# Altium footprint library HDR2.54.PcbLib: 242 footprints (part 11 of 16)
Each footprint in its own frame and in the unit in brackets; x right, y up, seen from the top. Pads: shape width x height; smd on the part's side, far side on the other; paste and mask are expansions set on the pad; w line width, h text height; cw(c..) or ccw(c..) is an arc to the next point about the centre after c.
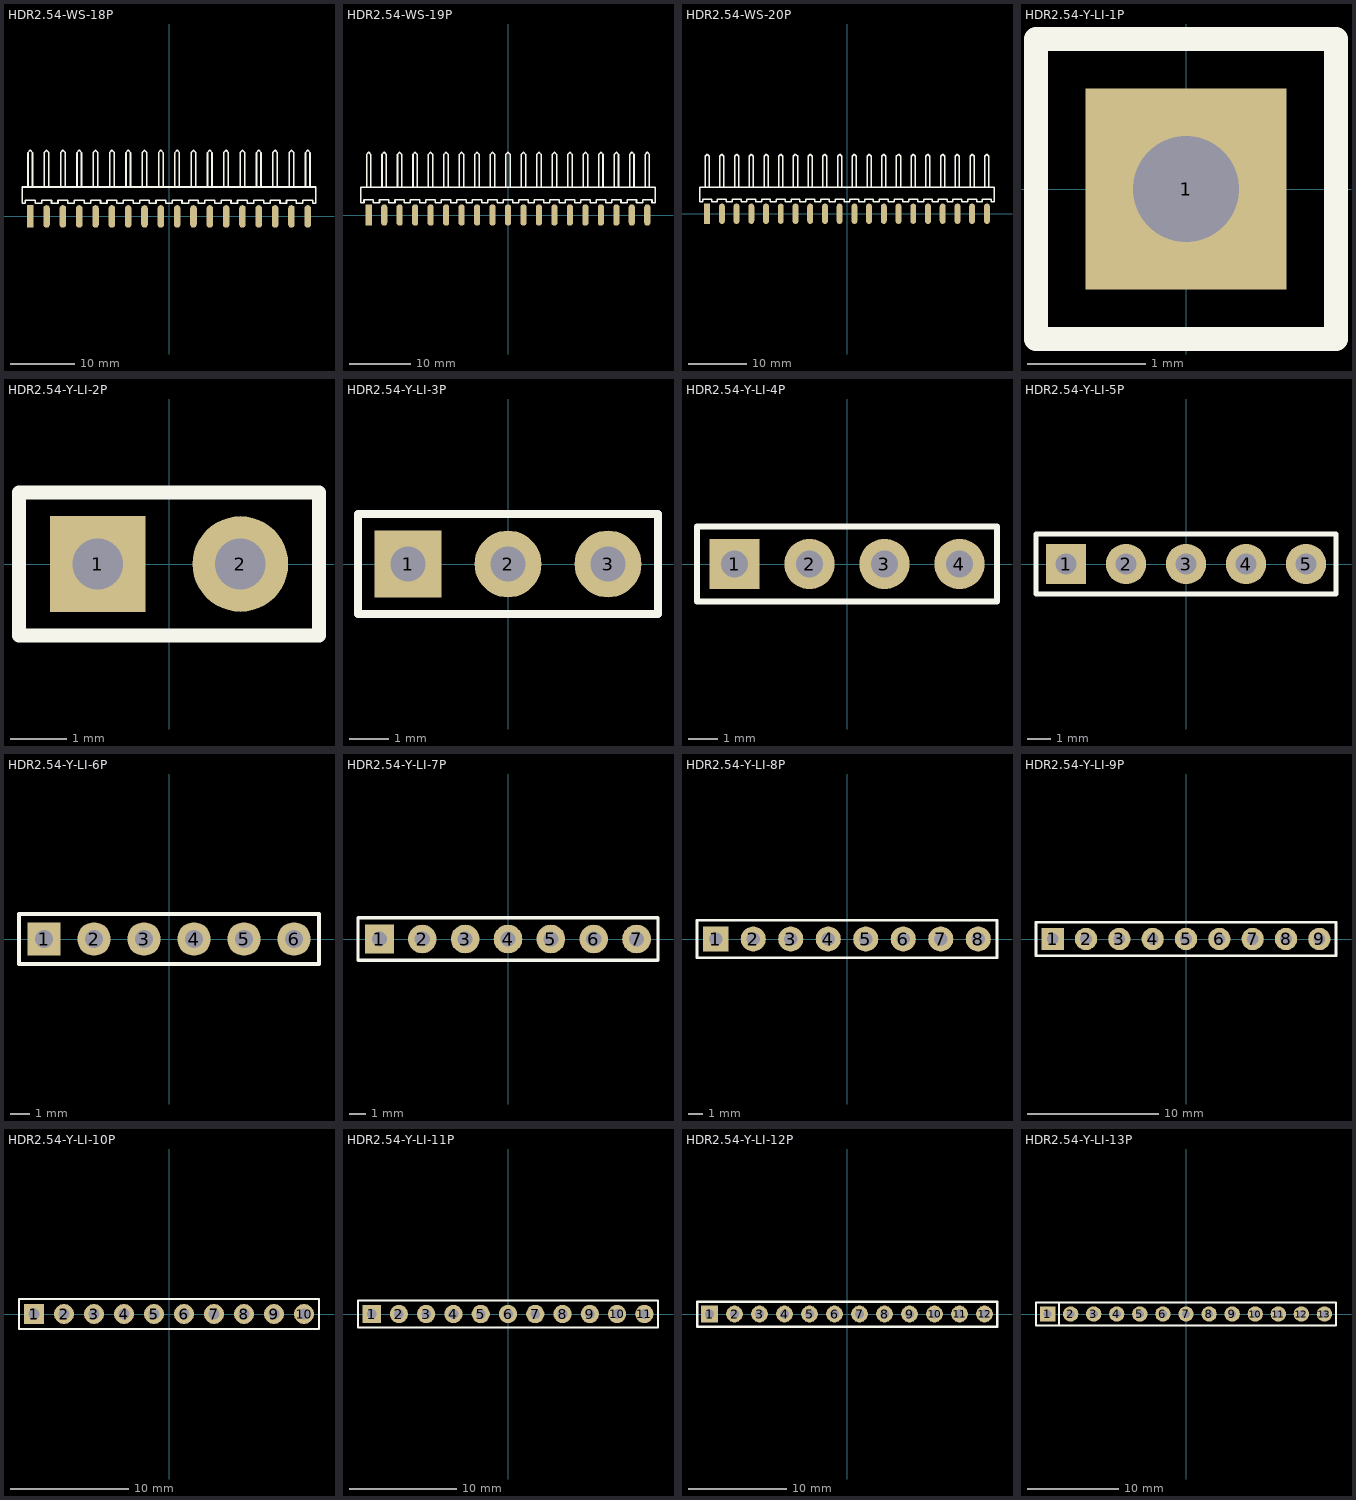
[diagram p10: the footprints below, top view; thin cyan lines are the x and y axes]

## HDR2.54-WS-18P [mm] "18P��ʽ��Ƭ����2.54"
pads (18):
  rect 1.02x3.5 smd: 1(-21.59,0)
  oval 1.02x3.5 smd: 2(-19.05,0) 3(-16.51,0) 4(-13.97,0) 5(-11.43,0) 6(-8.89,0) 7(-6.35,0) 8(-3.81,0) 9(-1.27,0) 10(1.27,0) 11(3.81,0) 12(6.35,0) 13(8.89,0) 14(11.43,0) 15(13.97,0) 16(16.51,0) 17(19.05,0) 18(21.59,0)
Top Overlay:
  drawing of 236 lines, arcs and shapes, not listed
3D body "HDR2.54 S-W-1P.STEP": height 2.54, standoff -0.01, extent 20.32,-0.76 22.86,10.34
3D body "HDR2.54 S-W-1P.STEP": height 2.54, standoff -0.01, extent 17.78,-0.76 20.32,10.34
3D body "HDR2.54 S-W-1P.STEP": height 2.54, standoff -0.01, extent 15.24,-0.76 17.78,10.34
3D body "HDR2.54 S-W-1P.STEP": height 2.54, standoff -0.01, extent 12.7,-0.76 15.24,10.34
3D body "HDR2.54 S-W-1P.STEP": height 2.54, standoff -0.01, extent 7.62,-0.76 10.16,10.34
3D body "HDR2.54 S-W-1P.STEP": height 2.54, standoff -0.01, extent 5.08,-0.76 7.62,10.34
3D body "HDR2.54 S-W-1P.STEP": height 2.54, standoff -0.01, extent 2.54,-0.76 5.08,10.34
3D body "HDR2.54 S-W-1P.STEP": height 2.54, standoff -0.01, extent 0,-0.76 2.54,10.34
3D body "HDR2.54 S-W-1P.STEP": height 2.54, standoff -0.01, extent -2.54,-0.76 0,10.34
3D body "HDR2.54 S-W-1P.STEP": height 2.54, standoff -0.01, extent -5.08,-0.76 -2.54,10.34
3D body "HDR2.54 S-W-1P.STEP": height 2.54, standoff -0.01, extent -7.62,-0.76 -5.08,10.34
3D body "HDR2.54 S-W-1P.STEP": height 2.54, standoff -0.01, extent -10.16,-0.76 -7.62,10.34
3D body "HDR2.54 S-W-1P.STEP": height 2.54, standoff -0.01, extent -22.86,-0.76 -20.32,10.34
3D body "HDR2.54 S-W-1P.STEP": height 2.54, standoff -0.01, extent -20.32,-0.76 -17.78,10.34
3D body "HDR2.54 S-W-1P.STEP": height 2.54, standoff -0.01, extent -17.78,-0.76 -15.24,10.34
3D body "HDR2.54 S-W-1P.STEP": height 2.54, standoff -0.01, extent -15.24,-0.76 -12.7,10.34
3D body "HDR2.54 S-W-1P.STEP": height 2.54, standoff -0.01, extent -12.7,-0.76 -10.16,10.34
3D body "HDR2.54 S-W-1P.STEP": height 2.54, standoff -0.01, extent 10.16,-0.76 12.7,10.34

## HDR2.54-WS-19P [mm] "19P��ʽ��Ƭ����2.54  �Ա�ID:�ƾ���ʯ   ������ַ:https://shop463601444.taobao.com"
pads (19):
  rect 1.02x3.5 smd: 1(-22.86,0)
  oval 1.02x3.5 smd: 2(-20.32,0) 3(-17.78,0) 4(-15.24,0) 5(-12.7,0) 6(-10.16,0) 7(-7.62,0) 8(-5.08,0) 9(-2.54,0) 10(0,0) 11(2.54,0) 12(5.08,0) 13(7.62,0) 14(10.16,0) 15(12.7,0) 16(15.24,0) 17(17.78,0) 18(20.32,0) 19(22.86,0)
Top Overlay:
  drawing of 249 lines, arcs and shapes, not listed
3D body "HDR2.54 S-W-1P.STEP": height 2.54, standoff -0.01, extent 21.59,-0.76 24.13,10.34
3D body "HDR2.54 S-W-1P.STEP": height 2.54, standoff -0.01, extent 19.05,-0.76 21.59,10.34
3D body "HDR2.54 S-W-1P.STEP": height 2.54, standoff -0.01, extent 16.51,-0.76 19.05,10.34
3D body "HDR2.54 S-W-1P.STEP": height 2.54, standoff -0.01, extent 13.97,-0.76 16.51,10.34
3D body "HDR2.54 S-W-1P.STEP": height 2.54, standoff -0.01, extent 11.43,-0.76 13.97,10.34
3D body "HDR2.54 S-W-1P.STEP": height 2.54, standoff -0.01, extent 6.35,-0.76 8.89,10.34
3D body "HDR2.54 S-W-1P.STEP": height 2.54, standoff -0.01, extent 3.81,-0.76 6.35,10.34
3D body "HDR2.54 S-W-1P.STEP": height 2.54, standoff -0.01, extent 1.27,-0.76 3.81,10.34
3D body "HDR2.54 S-W-1P.STEP": height 2.54, standoff -0.01, extent -1.27,-0.76 1.27,10.34
3D body "HDR2.54 S-W-1P.STEP": height 2.54, standoff -0.01, extent -3.81,-0.76 -1.27,10.34
3D body "HDR2.54 S-W-1P.STEP": height 2.54, standoff -0.01, extent -6.35,-0.76 -3.81,10.34
3D body "HDR2.54 S-W-1P.STEP": height 2.54, standoff -0.01, extent -8.89,-0.76 -6.35,10.34
3D body "HDR2.54 S-W-1P.STEP": height 2.54, standoff -0.01, extent -11.43,-0.76 -8.89,10.34
3D body "HDR2.54 S-W-1P.STEP": height 2.54, standoff -0.01, extent -24.13,-0.76 -21.59,10.34
3D body "HDR2.54 S-W-1P.STEP": height 2.54, standoff -0.01, extent -21.59,-0.76 -19.05,10.34
3D body "HDR2.54 S-W-1P.STEP": height 2.54, standoff -0.01, extent -19.05,-0.76 -16.51,10.34
3D body "HDR2.54 S-W-1P.STEP": height 2.54, standoff -0.01, extent -16.51,-0.76 -13.97,10.34
3D body "HDR2.54 S-W-1P.STEP": height 2.54, standoff -0.01, extent -13.97,-0.76 -11.43,10.34
3D body "HDR2.54 S-W-1P.STEP": height 2.54, standoff -0.01, extent 8.89,-0.76 11.43,10.34

## HDR2.54-WS-20P [mm] "20P��ʽ��Ƭ����2.54"
pads (20):
  rect 1.02x3.5 smd: 1(-24.13,0)
  oval 1.02x3.5 smd: 2(-21.59,0) 3(-19.05,0) 4(-16.51,0) 5(-13.97,0) 6(-11.43,0) 7(-8.89,0) 8(-6.35,0) 9(-3.81,0) 10(-1.27,0) 11(1.27,0) 12(3.81,0) 13(6.35,0) 14(8.89,0) 15(11.43,0) 16(13.97,0) 17(16.51,0) 18(19.05,0) 19(21.59,0) 20(24.13,0)
Top Overlay:
  drawing of 262 lines, arcs and shapes, not listed
3D body "HDR2.54 S-W-1P.STEP": height 2.54, standoff -0.01, extent 22.86,-0.76 25.4,10.34
3D body "HDR2.54 S-W-1P.STEP": height 2.54, standoff -0.01, extent 7.62,-0.76 10.16,10.34
3D body "HDR2.54 S-W-1P.STEP": height 2.54, standoff -0.01, extent -15.24,-0.76 -12.7,10.34
3D body "HDR2.54 S-W-1P.STEP": height 2.54, standoff -0.01, extent -17.78,-0.76 -15.24,10.34
3D body "HDR2.54 S-W-1P.STEP": height 2.54, standoff -0.01, extent -20.32,-0.76 -17.78,10.34
3D body "HDR2.54 S-W-1P.STEP": height 2.54, standoff -0.01, extent -22.86,-0.76 -20.32,10.34
3D body "HDR2.54 S-W-1P.STEP": height 2.54, standoff -0.01, extent -25.4,-0.76 -22.86,10.34
3D body "HDR2.54 S-W-1P.STEP": height 2.54, standoff -0.01, extent -12.7,-0.76 -10.16,10.34
3D body "HDR2.54 S-W-1P.STEP": height 2.54, standoff -0.01, extent -10.16,-0.76 -7.62,10.34
3D body "HDR2.54 S-W-1P.STEP": height 2.54, standoff -0.01, extent -7.62,-0.76 -5.08,10.34
3D body "HDR2.54 S-W-1P.STEP": height 2.54, standoff -0.01, extent -5.08,-0.76 -2.54,10.34
3D body "HDR2.54 S-W-1P.STEP": height 2.54, standoff -0.01, extent -2.54,-0.76 0,10.34
3D body "HDR2.54 S-W-1P.STEP": height 2.54, standoff -0.01, extent 0,-0.76 2.54,10.34
3D body "HDR2.54 S-W-1P.STEP": height 2.54, standoff -0.01, extent 2.54,-0.76 5.08,10.34
3D body "HDR2.54 S-W-1P.STEP": height 2.54, standoff -0.01, extent 5.08,-0.76 7.62,10.34
3D body "HDR2.54 S-W-1P.STEP": height 2.54, standoff -0.01, extent 10.16,-0.76 12.7,10.34
3D body "HDR2.54 S-W-1P.STEP": height 2.54, standoff -0.01, extent 12.7,-0.76 15.24,10.34
3D body "HDR2.54 S-W-1P.STEP": height 2.54, standoff -0.01, extent 15.24,-0.76 17.78,10.34
3D body "HDR2.54 S-W-1P.STEP": height 2.54, standoff -0.01, extent 17.78,-0.76 20.32,10.34
3D body "HDR2.54 S-W-1P.STEP": height 2.54, standoff -0.01, extent 20.32,-0.76 22.86,10.34

## HDR2.54-Y-LI-1P [mm] "Բ����ĸ��1��"
pads (1):
  rect 1.7x1.7 hole 0.9: 1(0,0)
Top Overlay:
  lines w0.2: -1.27,-1.27 1.27,-1.27 1.27,1.27 -1.27,1.27 -1.27,-1.27
3D body "HDR-1P_Y.STEP": height 4.31, standoff -3, extent -1.27,-1.27 1.27,1.27

## HDR2.54-Y-LI-2P [mm] "Բ����ĸ��2��"
pads (2):
  rect 1.7x1.7 hole 0.9: 1(-1.27,0)
  round 1.7 hole 0.9: 2(1.27,0)
Top Overlay:
  lines w0.254: -2.667,-1.27 2.667,-1.27 2.667,1.27 -2.667,1.27 -2.667,-1.27
3D body "HDR-1P_Y.STEP": height 4.31, standoff -3, extent -2.54,-1.27 0,1.27
3D body "HDR-1P_Y.STEP": height 4.31, standoff -3, extent 0,-1.27 2.54,1.27

## HDR2.54-Y-LI-3P [mm] "Բ����ĸ��3��"
pads (3):
  rect 1.7x1.7 hole 0.9: 1(-2.54,0)
  round 1.7 hole 0.9: 2(0,0) 3(2.54,0)
Top Overlay:
  lines w0.2: -3.81,-1.27 3.81,-1.27 3.81,1.27 -3.81,1.27 -3.81,-1.27
3D body "HDR-1P_Y.STEP": height 4.31, standoff -3, extent -3.81,-1.27 -1.27,1.27
3D body "HDR-1P_Y.STEP": height 4.31, standoff -3, extent -1.27,-1.27 1.27,1.27
3D body "HDR-1P_Y.STEP": height 4.31, standoff -3, extent 1.27,-1.27 3.81,1.27

## HDR2.54-Y-LI-4P [mm] "Բ����ĸ��4��"
pads (4):
  rect 1.7x1.7 hole 0.9: 1(-3.81,0)
  round 1.7 hole 0.9: 2(-1.27,0) 3(1.27,0) 4(3.81,0)
Top Overlay:
  lines w0.2: -5.08,-1.27 5.08,-1.27 5.08,1.27 -5.08,1.27 -5.08,-1.27
3D body "HDR-1P_Y.STEP": height 4.31, standoff -3, extent -5.08,-1.27 -2.54,1.27
3D body "HDR-1P_Y.STEP": height 4.31, standoff -3, extent -2.54,-1.27 0,1.27
3D body "HDR-1P_Y.STEP": height 4.31, standoff -3, extent 0,-1.27 2.54,1.27
3D body "HDR-1P_Y.STEP": height 4.31, standoff -3, extent 2.54,-1.27 5.08,1.27

## HDR2.54-Y-LI-5P [mm] "Բ����ĸ��5��"
pads (5):
  rect 1.7x1.7 hole 0.9: 1(-5.08,0)
  round 1.7 hole 0.9: 2(-2.54,0) 3(0,0) 4(2.54,0) 5(5.08,0)
Top Overlay:
  lines w0.2: -6.35,-1.27 6.35,-1.27 6.35,1.27 -6.35,1.27 -6.35,-1.27
3D body "HDR-1P_Y.STEP": height 4.31, standoff -3, extent 3.81,-1.27 6.35,1.27
3D body "HDR-1P_Y.STEP": height 4.31, standoff -3, extent 1.27,-1.27 3.81,1.27
3D body "HDR-1P_Y.STEP": height 4.31, standoff -3, extent -1.27,-1.27 1.27,1.27
3D body "HDR-1P_Y.STEP": height 4.31, standoff -3, extent -3.81,-1.27 -1.27,1.27
3D body "HDR-1P_Y.STEP": height 4.31, standoff -3, extent -6.35,-1.27 -3.81,1.27

## HDR2.54-Y-LI-6P [mm] "Բ����ĸ��6��"
pads (6):
  rect 1.7x1.7 hole 0.9: 1(-6.35,0)
  round 1.7 hole 0.9: 2(-3.81,0) 3(-1.27,0) 4(1.27,0) 5(3.81,0) 6(6.35,0)
Top Overlay:
  lines w0.2: -7.62,-1.27 7.62,-1.27 7.62,1.27 -7.62,1.27 -7.62,-1.27
3D body "HDR-1P_Y.STEP": height 4.31, standoff -3, extent -7.62,-1.27 -5.08,1.27
3D body "HDR-1P_Y.STEP": height 4.31, standoff -3, extent -5.08,-1.27 -2.54,1.27
3D body "HDR-1P_Y.STEP": height 4.31, standoff -3, extent -2.54,-1.27 0,1.27
3D body "HDR-1P_Y.STEP": height 4.31, standoff -3, extent 0,-1.27 2.54,1.27
3D body "HDR-1P_Y.STEP": height 4.31, standoff -3, extent 2.54,-1.27 5.08,1.27
3D body "HDR-1P_Y.STEP": height 4.31, standoff -3, extent 5.08,-1.27 7.62,1.27

## HDR2.54-Y-LI-7P [mm] "Բ����ĸ��7��"
pads (7):
  rect 1.7x1.7 hole 0.9: 1(-7.62,0)
  round 1.7 hole 0.9: 2(-5.08,0) 3(-2.54,0) 4(0,0) 5(2.54,0) 6(5.08,0) 7(7.62,0)
Top Overlay:
  lines w0.2: -8.89,-1.27 8.89,-1.27 8.89,1.27 -8.89,1.27 -8.89,-1.27
3D body "HDR-1P_Y.STEP": height 4.31, standoff -3, extent -8.89,-1.27 -6.35,1.27
3D body "HDR-1P_Y.STEP": height 4.31, standoff -3, extent -6.35,-1.27 -3.81,1.27
3D body "HDR-1P_Y.STEP": height 4.31, standoff -3, extent -3.81,-1.27 -1.27,1.27
3D body "HDR-1P_Y.STEP": height 4.31, standoff -3, extent -1.27,-1.27 1.27,1.27
3D body "HDR-1P_Y.STEP": height 4.31, standoff -3, extent 1.27,-1.27 3.81,1.27
3D body "HDR-1P_Y.STEP": height 4.31, standoff -3, extent 3.81,-1.27 6.35,1.27
3D body "HDR-1P_Y.STEP": height 4.31, standoff -3, extent 6.35,-1.27 8.89,1.27

## HDR2.54-Y-LI-8P [mm] "Բ����ĸ��8��"
pads (8):
  rect 1.7x1.7 hole 0.9: 1(-8.89,0)
  round 1.7 hole 0.9: 2(-6.35,0) 3(-3.81,0) 4(-1.27,0) 5(1.27,0) 6(3.81,0) 7(6.35,0) 8(8.89,0)
Top Overlay:
  lines w0.2: -10.16,-1.27 -10.16,1.27 10.16,1.27 10.16,-1.27 -10.16,-1.27
3D body "HDR-1P_Y.STEP": height 4.31, standoff -3, extent 7.62,-1.27 10.16,1.27
3D body "HDR-1P_Y.STEP": height 4.31, standoff -3, extent 5.08,-1.27 7.62,1.27
3D body "HDR-1P_Y.STEP": height 4.31, standoff -3, extent 2.54,-1.27 5.08,1.27
3D body "HDR-1P_Y.STEP": height 4.31, standoff -3, extent 0,-1.27 2.54,1.27
3D body "HDR-1P_Y.STEP": height 4.31, standoff -3, extent -2.54,-1.27 0,1.27
3D body "HDR-1P_Y.STEP": height 4.31, standoff -3, extent -5.08,-1.27 -2.54,1.27
3D body "HDR-1P_Y.STEP": height 4.31, standoff -3, extent -7.62,-1.27 -5.08,1.27
3D body "HDR-1P_Y.STEP": height 4.31, standoff -3, extent -10.16,-1.27 -7.62,1.27

## HDR2.54-Y-LI-9P [mm] "Բ����ĸ��9��"
pads (9):
  rect 1.7x1.7 hole 0.9: 1(-10.16,0)
  round 1.7 hole 0.9: 2(-7.62,0) 3(-5.08,0) 4(-2.54,0) 5(0,0) 6(2.54,0) 7(5.08,0) 8(7.62,0) 9(10.16,0)
Top Overlay:
  lines w0.2: -11.43,-1.27 11.43,-1.27 11.43,1.27 -11.43,1.27 -11.43,-1.27
3D body "HDR-1P_Y.STEP": height 4.31, standoff -3, extent 8.89,-1.27 11.43,1.27
3D body "HDR-1P_Y.STEP": height 4.31, standoff -3, extent 6.35,-1.27 8.89,1.27
3D body "HDR-1P_Y.STEP": height 4.31, standoff -3, extent 3.81,-1.27 6.35,1.27
3D body "HDR-1P_Y.STEP": height 4.31, standoff -3, extent 1.27,-1.27 3.81,1.27
3D body "HDR-1P_Y.STEP": height 4.31, standoff -3, extent -1.27,-1.27 1.27,1.27
3D body "HDR-1P_Y.STEP": height 4.31, standoff -3, extent -3.81,-1.27 -1.27,1.27
3D body "HDR-1P_Y.STEP": height 4.31, standoff -3, extent -6.35,-1.27 -3.81,1.27
3D body "HDR-1P_Y.STEP": height 4.31, standoff -3, extent -8.89,-1.27 -6.35,1.27
3D body "HDR-1P_Y.STEP": height 4.31, standoff -3, extent -11.43,-1.27 -8.89,1.27

## HDR2.54-Y-LI-10P [mm] "Բ����ĸ��10��"
pads (10):
  rect 1.7x1.7 hole 0.9: 1(-11.43,0)
  round 1.7 hole 0.9: 2(-8.89,0) 3(-6.35,0) 4(-3.81,0) 5(-1.27,0) 6(1.27,0) 7(3.81,0) 8(6.35,0) 9(8.89,0) 10(11.43,0)
Top Overlay:
  lines w0.2: -12.7,-1.27 -12.7,1.27 12.7,1.27 12.7,-1.27 -12.7,-1.27
3D body "HDR-1P_Y.STEP": height 4.31, standoff -3, extent 10.16,-1.27 12.7,1.27
3D body "HDR-1P_Y.STEP": height 4.31, standoff -3, extent 7.62,-1.27 10.16,1.27
3D body "HDR-1P_Y.STEP": height 4.31, standoff -3, extent 5.08,-1.27 7.62,1.27
3D body "HDR-1P_Y.STEP": height 4.31, standoff -3, extent 2.54,-1.27 5.08,1.27
3D body "HDR-1P_Y.STEP": height 4.31, standoff -3, extent 0,-1.27 2.54,1.27
3D body "HDR-1P_Y.STEP": height 4.31, standoff -3, extent -2.54,-1.27 0,1.27
3D body "HDR-1P_Y.STEP": height 4.31, standoff -3, extent -5.08,-1.27 -2.54,1.27
3D body "HDR-1P_Y.STEP": height 4.31, standoff -3, extent -7.62,-1.27 -5.08,1.27
3D body "HDR-1P_Y.STEP": height 4.31, standoff -3, extent -10.16,-1.27 -7.62,1.27
3D body "HDR-1P_Y.STEP": height 4.31, standoff -3, extent -12.7,-1.27 -10.16,1.27

## HDR2.54-Y-LI-11P [mm] "Բ����ĸ��11��"
pads (11):
  rect 1.7x1.7 hole 0.9: 1(-12.7,0)
  round 1.7 hole 0.9: 2(-10.16,0) 3(-7.62,0) 4(-5.08,0) 5(-2.54,0) 6(0,0) 7(2.54,0) 8(5.08,0) 9(7.62,0) 10(10.16,0) 11(12.7,0)
Top Overlay:
  lines w0.2: -13.97,-1.27 13.97,-1.27 13.97,1.27 -13.97,1.27 -13.97,-1.27
3D body "HDR-1P_Y.STEP": height 4.31, standoff -3, extent -13.97,-1.27 -11.43,1.27
3D body "HDR-1P_Y.STEP": height 4.31, standoff -3, extent -11.43,-1.27 -8.89,1.27
3D body "HDR-1P_Y.STEP": height 4.31, standoff -3, extent -8.89,-1.27 -6.35,1.27
3D body "HDR-1P_Y.STEP": height 4.31, standoff -3, extent -6.35,-1.27 -3.81,1.27
3D body "HDR-1P_Y.STEP": height 4.31, standoff -3, extent -3.81,-1.27 -1.27,1.27
3D body "HDR-1P_Y.STEP": height 4.31, standoff -3, extent -1.27,-1.27 1.27,1.27
3D body "HDR-1P_Y.STEP": height 4.31, standoff -3, extent 1.27,-1.27 3.81,1.27
3D body "HDR-1P_Y.STEP": height 4.31, standoff -3, extent 3.81,-1.27 6.35,1.27
3D body "HDR-1P_Y.STEP": height 4.31, standoff -3, extent 6.35,-1.27 8.89,1.27
3D body "HDR-1P_Y.STEP": height 4.31, standoff -3, extent 8.89,-1.27 11.43,1.27
3D body "HDR-1P_Y.STEP": height 4.31, standoff -3, extent 11.43,-1.27 13.97,1.27

## HDR2.54-Y-LI-12P [mm] "Բ����ĸ��12��"
pads (12):
  rect 1.7x1.7 hole 0.9: 1(-13.97,0)
  round 1.7 hole 0.9: 2(-11.43,0) 3(-8.89,0) 4(-6.35,0) 5(-3.81,0) 6(-1.27,0) 7(1.27,0) 8(3.81,0) 9(6.35,0) 10(8.89,0) 11(11.43,0) 12(13.97,0)
Top Overlay:
  lines w0.254: -15.24,-1.27 -15.24,1.27 15.24,1.27 15.24,-1.27 -15.24,-1.27
3D body "HDR-1P_Y.STEP": height 4.31, standoff -3, extent -15.24,-1.27 -12.7,1.27
3D body "HDR-1P_Y.STEP": height 4.31, standoff -3, extent -12.7,-1.27 -10.16,1.27
3D body "HDR-1P_Y.STEP": height 4.31, standoff -3, extent -10.16,-1.27 -7.62,1.27
3D body "HDR-1P_Y.STEP": height 4.31, standoff -3, extent -7.62,-1.27 -5.08,1.27
3D body "HDR-1P_Y.STEP": height 4.31, standoff -3, extent -5.08,-1.27 -2.54,1.27
3D body "HDR-1P_Y.STEP": height 4.31, standoff -3, extent -2.54,-1.27 0,1.27
3D body "HDR-1P_Y.STEP": height 4.31, standoff -3, extent 0,-1.27 2.54,1.27
3D body "HDR-1P_Y.STEP": height 4.31, standoff -3, extent 2.54,-1.27 5.08,1.27
3D body "HDR-1P_Y.STEP": height 4.31, standoff -3, extent 5.08,-1.27 7.62,1.27
3D body "HDR-1P_Y.STEP": height 4.31, standoff -3, extent 7.62,-1.27 10.16,1.27
3D body "HDR-1P_Y.STEP": height 4.31, standoff -3, extent 10.16,-1.27 12.7,1.27
3D body "HDR-1P_Y.STEP": height 4.31, standoff -3, extent 12.7,-1.27 15.24,1.27

## HDR2.54-Y-LI-13P [mm] "Բ����ĸ��13��"
pads (13):
  rect 1.7x1.7 hole 0.9: 1(-15.24,0)
  round 1.7 hole 0.9: 2(-12.7,0) 3(-10.16,0) 4(-7.62,0) 5(-5.08,0) 6(-2.54,0) 7(0,0) 8(2.54,0) 9(5.08,0) 10(7.62,0) 11(10.16,0) 12(12.7,0) 13(15.24,0)
Top Overlay:
  lines w0.2: -13.99,-1.25 -13.99,1.25 ; -16.51,-1.27 -16.51,1.27 -14.605,1.27 16.51,1.27 16.51,-1.27 -16.51,-1.27
3D body "HDR-1P_Y.STEP": height 4.31, standoff -3, extent -16.51,-1.27 -13.97,1.27
3D body "HDR-1P_Y.STEP": height 4.31, standoff -3, extent -13.97,-1.27 -11.43,1.27
3D body "HDR-1P_Y.STEP": height 4.31, standoff -3, extent -11.43,-1.27 -8.89,1.27
3D body "HDR-1P_Y.STEP": height 4.31, standoff -3, extent -8.89,-1.27 -6.35,1.27
3D body "HDR-1P_Y.STEP": height 4.31, standoff -3, extent -6.35,-1.27 -3.81,1.27
3D body "HDR-1P_Y.STEP": height 4.31, standoff -3, extent -3.81,-1.27 -1.27,1.27
3D body "HDR-1P_Y.STEP": height 4.31, standoff -3, extent -1.27,-1.27 1.27,1.27
3D body "HDR-1P_Y.STEP": height 4.31, standoff -3, extent 1.27,-1.27 3.81,1.27
3D body "HDR-1P_Y.STEP": height 4.31, standoff -3, extent 3.81,-1.27 6.35,1.27
3D body "HDR-1P_Y.STEP": height 4.31, standoff -3, extent 6.35,-1.27 8.89,1.27
3D body "HDR-1P_Y.STEP": height 4.31, standoff -3, extent 8.89,-1.27 11.43,1.27
3D body "HDR-1P_Y.STEP": height 4.31, standoff -3, extent 11.43,-1.27 13.97,1.27
3D body "HDR-1P_Y.STEP": height 4.31, standoff -3, extent 13.97,-1.27 16.51,1.27